# Altium footprint library ConnectorsTDH.PcbLib: 194 footprints (part 5 of 13)
Each footprint in its own frame and in the unit in brackets; x right, y up, seen from the top. Pads: shape width x height; smd on the part's side, far side on the other; paste and mask are expansions set on the pad; w line width, h text height; cw(c..) or ccw(c..) is an arc to the next point about the centre after c.
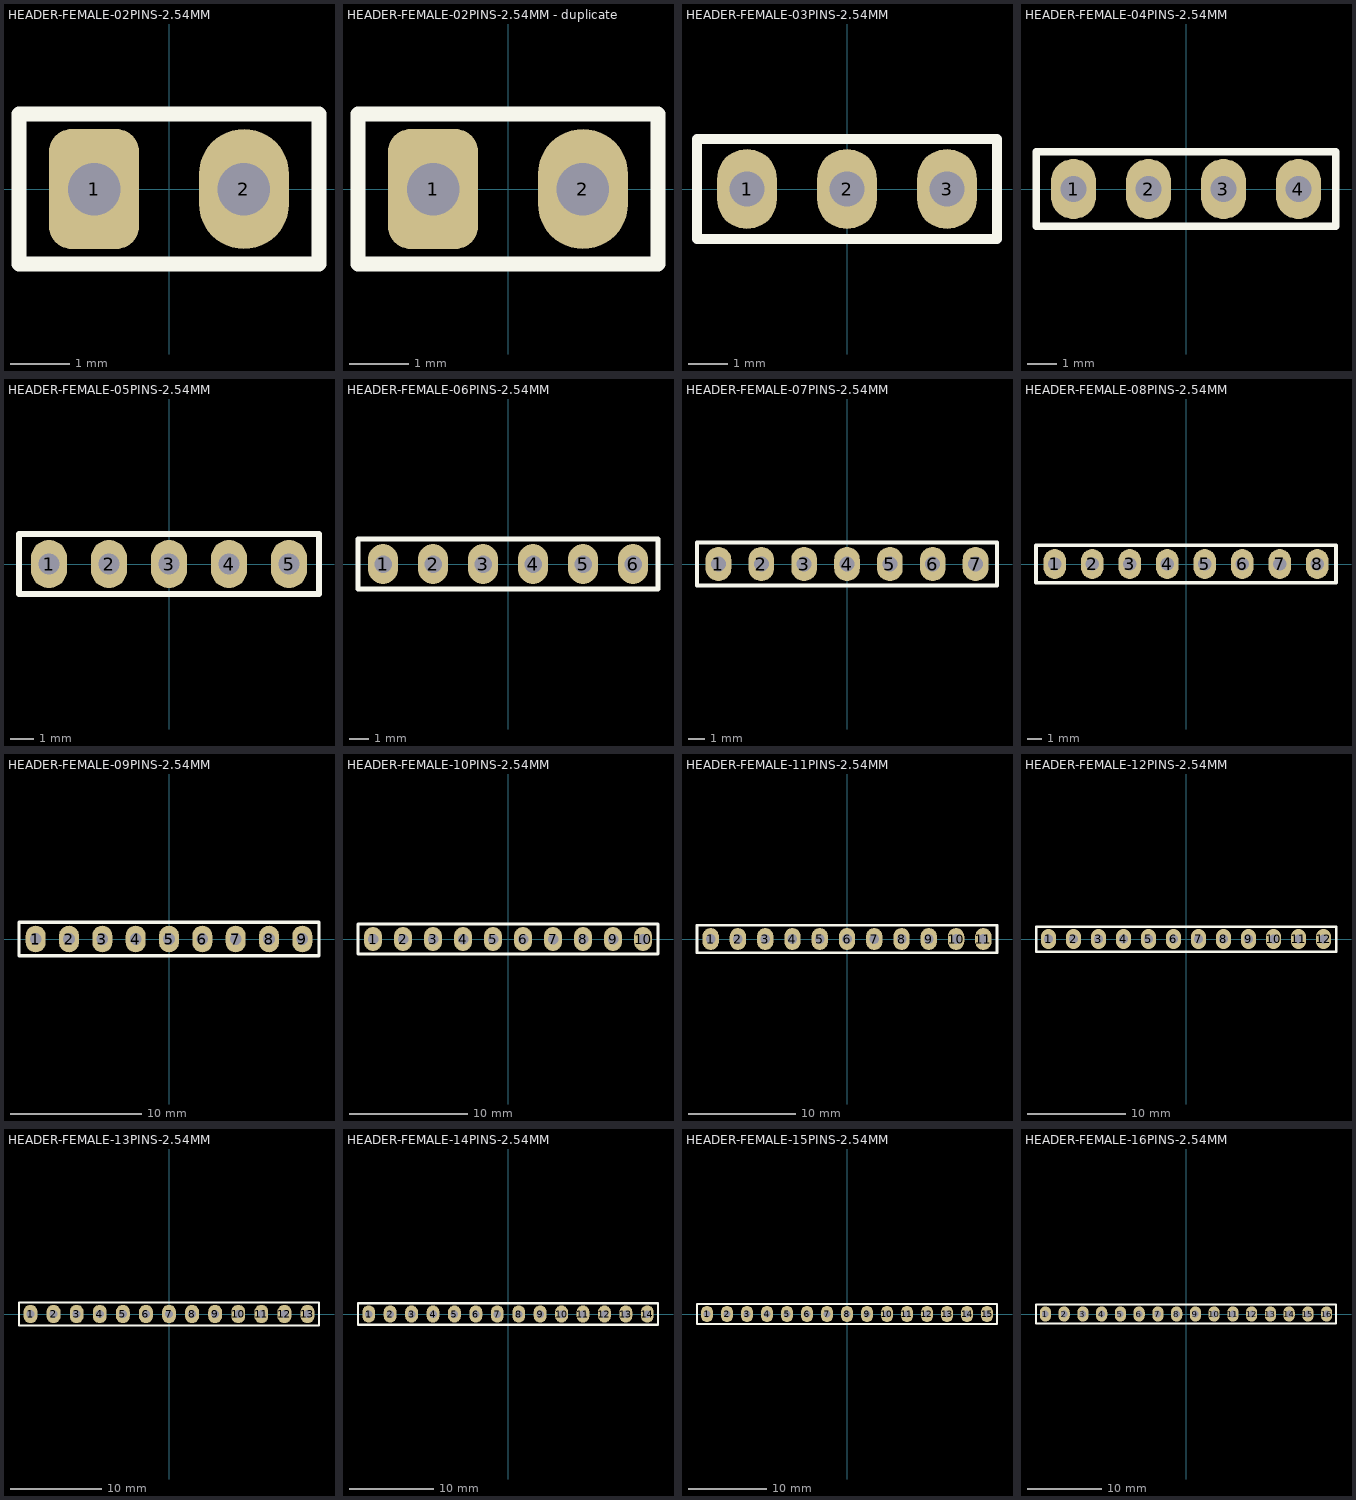
[diagram p4: the footprints below, top view; thin cyan lines are the x and y axes]

## HEADER-FEMALE-02PINS-2.54MM [mil]
pads (2):
  rrect50% 60x80 hole 35: 1(-50,0)
  oval 60x80 hole 35: 2(50,0)
Top Overlay:
  lines w10: -100,-50 -100,50 100,50 100,-50 -100,-50
3D body "2-Pin Header - Female - 2.54mm.step": height 196.85, standoff -118.11, extent -109.84,-49.21 109.85,49.22

## HEADER-FEMALE-02PINS-2.54MM - duplicate [mil]
pads (2):
  rrect50% 60x80 hole 35: 1(-50,0)
  oval 60x80 hole 35: 2(50,0)
Top Overlay:
  lines w10: -100,-50 100,-50 100,50 -100,50 -100,-50
3D body "2-Pin Header - Female - 2.54mm.step": height 196.85, standoff -118.11, extent -109.84,-49.21 109.85,49.22

## HEADER-FEMALE-03PINS-2.54MM [mil]
pads (3):
  oval 60x80 hole 35: 1(-100,0) 2(0,0) 3(100,0)
Top Overlay:
  lines w10: -150,-50 150,-50 150,50 -150,50 -150,-50
3D body "3-Pin Header - Female - 2.54mm.step": height 196.85, standoff -118.11, extent -159.84,-49.21 159.85,49.22

## HEADER-FEMALE-04PINS-2.54MM [mil]
pads (4):
  oval 60x80 hole 35: 1(-150,0) 2(-50,0) 3(50,0) 4(150,0)
Top Overlay:
  lines w10: -200,-50 -200,50 200,50 200,-50 -200,-50
3D body "4-Pin Header - Female - 2.54mm.step": height 196.85, standoff -118.11, extent -209.84,-49.21 209.85,49.22

## HEADER-FEMALE-05PINS-2.54MM [mil]
pads (5):
  oval 60x80 hole 35: 1(-200,0) 2(-100,0) 3(0,0) 4(100,0) 5(200,0)
Top Overlay:
  lines w10: -250,-50 250,-50 250,50 -250,50 -250,-50
3D body "5-Pin Header - Female - 2.54mm.step": height 196.85, standoff -118.11, extent -259.84,-49.21 259.85,49.22

## HEADER-FEMALE-06PINS-2.54MM [mil]
pads (6):
  oval 60x80 hole 35: 1(-250,0) 2(-150,0) 3(-50,0) 4(50,0) 5(150,0) 6(250,0)
Top Overlay:
  lines w10: -300,-50 -300,50 300,50 300,-50 -300,-50
3D body "6-Pin Header - Female - 2.54mm.step": height 196.85, standoff -118.11, extent -309.84,-49.21 309.85,49.22

## HEADER-FEMALE-07PINS-2.54MM [mil]
pads (7):
  oval 60x80 hole 35: 1(-300,0) 2(-200,0) 3(-100,0) 4(0,0) 5(100,0) 6(200,0) 7(300,0)
Top Overlay:
  lines w10: -350,-50 -350,50 350,50 350,-50 -350,-50
3D body "7-Pin Header - Female - 2.54mm.step": height 196.85, standoff -118.11, extent -359.84,-49.21 359.85,49.22

## HEADER-FEMALE-08PINS-2.54MM [mil]
pads (8):
  oval 60x80 hole 35: 1(-350,0) 2(-250,0) 3(-150,0) 4(-50,0) 5(50,0) 6(150,0) 7(250,0) 8(350,0)
Top Overlay:
  lines w10: -400,-50 -400,50 400,50 400,-50 -400,-50
3D body "8-Pin Header - Female - 2.54mm.step": height 196.85, standoff -118.11, extent -409.84,-49.21 409.85,49.22

## HEADER-FEMALE-09PINS-2.54MM [mil]
pads (9):
  oval 60x80 hole 35: 1(-400,0) 2(-300,0) 3(-200,0) 4(-100,0) 5(0,0) 6(100,0) 7(200,0) 8(300,0) 9(400,0)
Top Overlay:
  lines w10: -450,-50 -450,50 450,50 450,-50 -450,-50
3D body "9-Pin Header - Female - 2.54mm.step": height 196.85, standoff -118.11, extent -459.84,-49.21 459.85,49.22

## HEADER-FEMALE-10PINS-2.54MM [mil]
pads (10):
  oval 60x80 hole 35: 1(-450,0) 2(-350,0) 3(-250,0) 4(-150,0) 5(-50,0) 6(50,0) 7(150,0) 8(250,0) 9(350,0) 10(450,0)
Top Overlay:
  lines w10: -500,-50 -500,50 500,50 500,-50 -500,-50
3D body "10-Pin Header - Female - 2.54mm.step": height 196.85, standoff -118.11, extent -509.84,-49.21 509.85,49.22

## HEADER-FEMALE-11PINS-2.54MM [mil]
pads (11):
  oval 60x80 hole 35: 1(-500,0) 2(-400,0) 3(-300,0) 4(-200,0) 5(-100,0) 6(0,0) 7(100,0) 8(200,0) 9(300,0) 10(400,0) 11(500,0)
Top Overlay:
  lines w10: -550,-50 -550,50 550,50 550,-50 -550,-50
3D body "11-Pin Header - Female - 2.54mm.step": height 196.85, standoff -118.11, extent -559.84,-49.21 559.85,49.22

## HEADER-FEMALE-12PINS-2.54MM [mil]
pads (12):
  oval 60x80 hole 35: 1(-550,0) 2(-450,0) 3(-350,0) 4(-250,0) 5(-150,0) 6(-50,0) 7(50,0) 8(150,0) 9(250,0) 10(350,0) 11(450,0) 12(550,0)
Top Overlay:
  lines w10: -600,-50 600,-50 600,50 -600,50 -600,-50
3D body "12-Pin Header - Female - 2.54mm.step": height 196.85, standoff -118.11, extent -609.84,-49.21 609.85,49.22

## HEADER-FEMALE-13PINS-2.54MM [mil]
pads (13):
  oval 60x80 hole 35: 1(-600,0) 2(-500,0) 3(-400,0) 4(-300,0) 5(-200,0) 6(-100,0) 7(0,0) 8(100,0) 9(200,0) 10(300,0) 11(400,0) 12(500,0) 13(600,0)
Top Overlay:
  lines w10: -650,-50 650,-50 650,50 -650,50 -650,-50
3D body "13-Pin Header - Female - 2.54mm.step": height 196.85, standoff -118.11, extent -659.84,-49.21 659.85,49.22

## HEADER-FEMALE-14PINS-2.54MM [mil]
pads (14):
  oval 60x80 hole 35: 1(-650,0) 2(-550,0) 3(-450,0) 4(-350,0) 5(-250,0) 6(-150,0) 7(-50,0) 8(50,0) 9(150,0) 10(250,0) 11(350,0) 12(450,0) 13(550,0) 14(650,0)
Top Overlay:
  lines w10: -700,-50 -700,50 700,50 700,-50 -700,-50
3D body "14-Pin Header - Female - 2.54mm.step": height 196.85, standoff -118.11, extent -709.84,-49.21 709.85,49.22

## HEADER-FEMALE-15PINS-2.54MM [mil]
pads (15):
  oval 60x80 hole 35: 1(-700,0) 2(-600,0) 3(-500,0) 4(-400,0) 5(-300,0) 6(-200,0) 7(-100,0) 8(0,0) 9(100,0) 10(200,0) 11(300,0) 12(400,0) 13(500,0) 14(600,0) 15(700,0)
Top Overlay:
  lines w10: -750,-50 -750,50 750,50 750,-50 -750,-50
3D body "15-Pin Header - Female - 2.54mm.step": height 196.85, standoff -118.11, extent -759.84,-49.21 759.85,49.22

## HEADER-FEMALE-16PINS-2.54MM [mil]
pads (16):
  oval 60x80 hole 35: 1(-750,0) 2(-650,0) 3(-550,0) 4(-450,0) 5(-350,0) 6(-250,0) 7(-150,0) 8(-50,0) 9(50,0) 10(150,0) 11(250,0) 12(350,0) 13(450,0) 14(550,0) 15(650,0) 16(750,0)
Top Overlay:
  lines w10: -800,-50 -800,50 800,50 800,-50 -800,-50
3D body "16-Pin Header - Female - 2.54mm.step": height 196.85, standoff -118.11, extent -809.84,-49.21 809.85,49.22